# Altium footprint library LCLP.PcbLib: 75 footprints (part 5 of 5)
Each footprint in its own frame and in the unit in brackets; x right, y up, seen from the top. Pads: shape width x height; smd on the part's side, far side on the other; paste and mask are expansions set on the pad; w line width, h text height; cw(c..) or ccw(c..) is an arc to the next point about the centre after c.
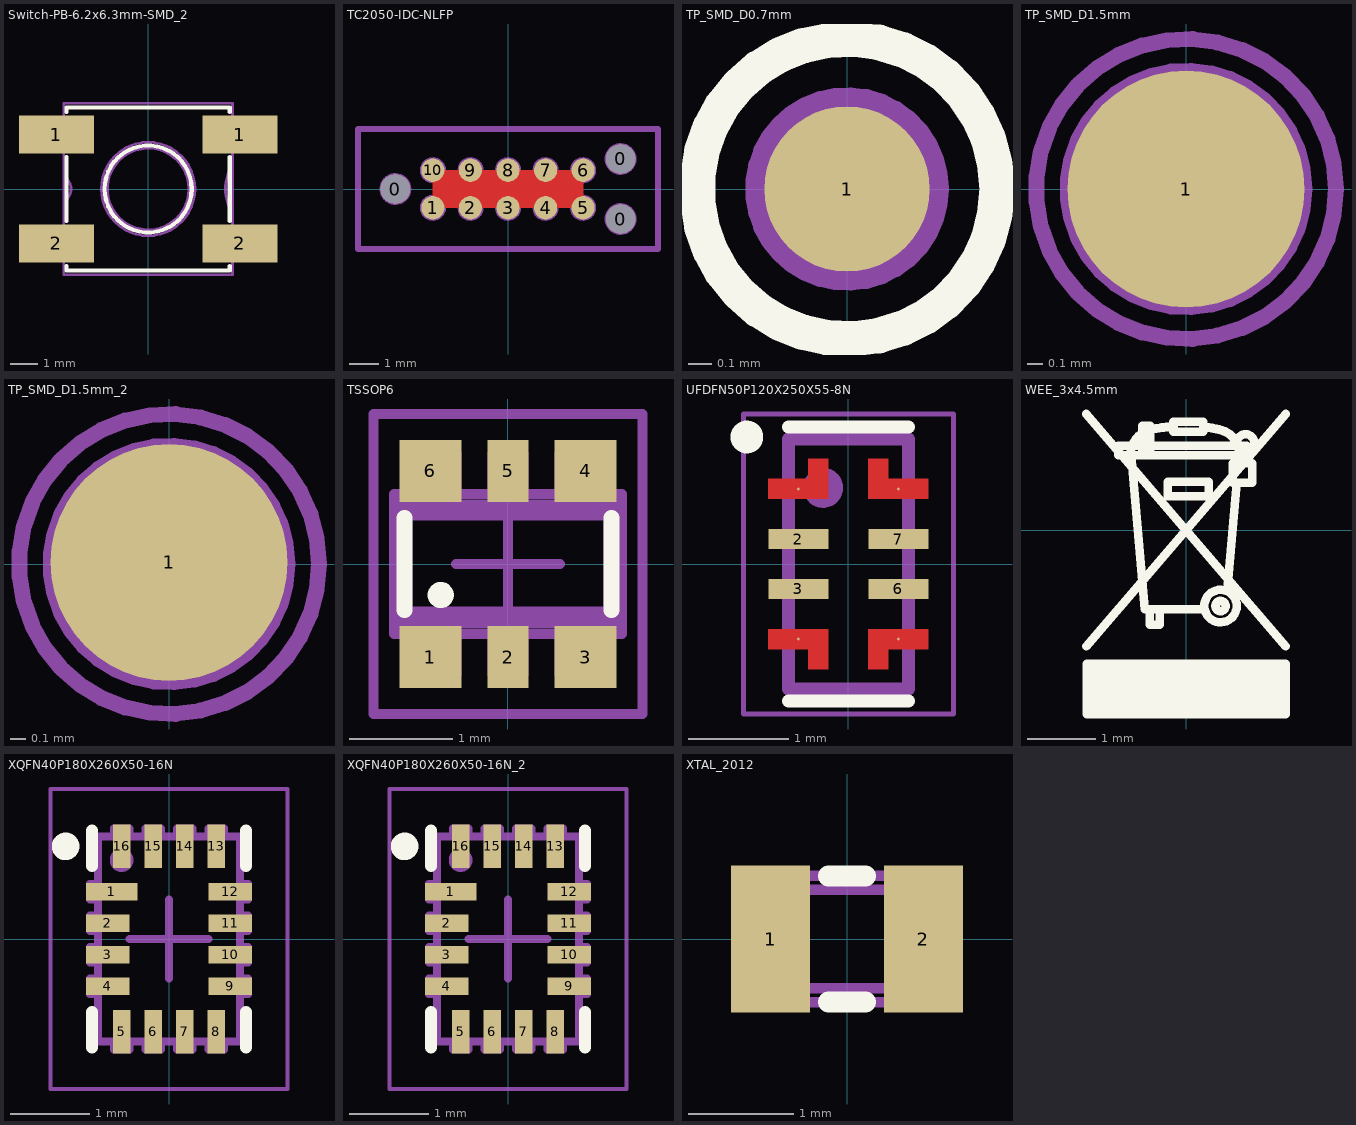
[diagram p4: the footprints below, top view; thin cyan lines are the x and y axes]

## Switch-PB-6.2x6.3mm-SMD_2 [mm]
pads (4):
  rect 2.75x1.4 smd: 1(-3.375,2) 1(3.375,2) 2(-3.375,-2) 2(3.375,-2)
Top Overlay:
  circle w0.152: c0,0 r1.601
  lines w0.152: -3,-2.826 -3,-3 3,-3 3,-2.826 ; -3,-1.174 -3,1.174 ; -3,2.826 -3,3 3,3 3,2.826 ; 3,-1.174 3,1.174
Mechanical 7:
  circle w0.1: c0,0 r1.5
  circle w0.1: c0,0 r1.721
  lines w0.1: -3.3,-2.393 -3.3,-1.606 ; -3.3,1.606 -3.3,2.393 ; -3.1,-2.393 -3.6,-2.393 -3.6,-1.606 -3.1,-1.606 ; -3.1,-0.441 ccw(c-3.335,0) -3.1,0.441 ; -3.1,1.606 -3.6,1.606 -3.6,2.393 -3.1,2.393 ; 3.1,-2.393 3.6,-2.393 3.6,-1.606 3.1,-1.606 ; 3.1,-0.91 cw(c4.561,0) 3.1,0.91 ; 3.1,1.606 3.6,1.606 3.6,2.393 3.1,2.393 ; 3.3,-2.393 3.3,-1.606 ; 3.3,1.606 3.3,2.393 ; -3.1,-3.15 3.1,-3.15 3.1,3.15 -3.1,3.15 -3.1,-3.15
  text ".Designator" at 1.525,0.102 h0.31
3D body "TS604VM1-025BR-R.step": height 2.5, standoff 0, extent -3.6,-3.1 3.6,3.1

## TC2050-IDC-NLFP [mil]
pads (13):
  round 39 hole 39 unplated mask+0.79: 0(-150,0) 0(150,-40) 0(150,40)
  round 31 smd paste-196.85: 1(-100,-25) 2(-50,-25) 3(0,-25) 4(50,-25) 5(100,-25) 6(100,25) 7(50,25) 8(0,25) 9(-50,25) 10(-100,25)
Top Layer:
  pour cut-out: -100,25 -100,-25 100,-25 100,25
Mechanical 7:
  circle w3.94: c-150,0 r19.26
  circle w3.94: c150,39.98 r19.26
  circle w3.94: c150,-39.98 r19.26
  circle w3.94: c100,24.99 r15.45
  circle w3.94: c100,-24.99 r15.45
  circle w3.94: c50,-24.99 r15.45
  circle w3.94: c50,24.99 r15.45
  circle w3.94: c-50,24.99 r15.45
  circle w3.94: c0,24.99 r15.45
  circle w3.94: c0,-24.99 r15.45
  circle w3.94: c-50,-24.99 r15.45
  circle w3.94: c-100,-24.99 r15.45
  circle w3.94: c-100,24.99 r15.45
  text ".Designator" at -59.75,-68.34 h12.01
Mechanical 8:
  circle w3.94: c150,-39.98 r19.26
  circle w3.94: c150,39.98 r19.26
  circle w3.94: c-150,0 r19.26
Mechanical 15:
  lines w7.87: -199.8,-79.92 199.8,-79.92 199.8,79.92 -199.8,79.92 -199.8,-79.92

## TP_SMD_D0.7mm [mm] "Test point - pad 0.7mm"
height 0.5
pads (1):
  round 0.7 smd paste-5: 1(0,0)
Top Overlay:
  circle w0.15: c0,0 r0.635
Mechanical 7:
  circle w0.1: c0,0 r0.635
  circle w0.1: c0,0 r0.381
  text ".Designator" at -0.274,-0.131 h0.3

## TP_SMD_D1.5mm [mm] "Test point - pad 1.5mm"
height 0.5
pads (1):
  round 1.5 smd paste-5: 1(0,0)
Mechanical 7:
  circle w0.1: c0,0 r0.75
  circle w0.1: c0,0 r0.95
  text ".Designator" at -1.524,-0.102 h0.3
3D body: height 0.05, standoff 0, extent -0.75,-0.75 0.75,0.75

## TP_SMD_D1.5mm_2 [mm]
pads (1):
  round 1.5 smd paste-5: 1(0,0.01)
Mechanical 7:
  circle w0.1: c0,0 r0.75
  circle w0.1: c0,0 r0.95
  text ".Designator" at -1.524,-0.102 h0.3
3D body: height 0.05, standoff 0, extent -0.75,-0.75 0.75,0.75

## TSSOP6 [mm] "TSSOP6 (SOT-363)"
height 1.1
pads (6):
  rect 0.6x0.6 smd: 1(-0.75,-0.9) 3(0.75,-0.9) 4(0.75,0.9) 6(-0.75,0.9)
  rect 0.4x0.6 smd: 2(0,-0.9) 5(0,0.9)
Top Overlay:
  circle w0.152: c-0.65,-0.3 r0.05
  lines w0.152: -1,-0.448 -1,0.448 ; 1,-0.448 1,0.448
Mechanical 7:
  lines w0.1: -0.975,-0.46 0.975,-0.46 ; -0.975,0.478 0.975,0.478 ; -0.8,-0.56 -0.8,-1.07 -0.5,-1.07 ; -0.8,0.56 -0.8,1.07 -0.5,1.07 -0.5,0.56 ; -0.791,-0.852 -0.527,-0.852 ; -0.791,-0.733 -0.527,-0.733 ; -0.782,-0.578 -0.518,-0.578 ; -0.782,0.578 -0.518,0.578 ; -0.773,0.733 -0.509,0.733 ; -0.773,0.852 -0.509,0.852 ; -0.5,-1.07 -0.5,-0.56 ; -0.15,-0.56 -0.15,-1.07 0.15,-1.07 0.15,-0.56 ; -0.15,0.56 -0.15,1.07 0.15,1.07 0.15,0.56 ; -0.141,-0.852 0.123,-0.852 ; -0.141,-0.733 0.123,-0.733 ; -0.132,-0.578 0.132,-0.578 ; -0.132,0.578 0.132,0.578 ; -0.123,0.733 0.141,0.733 ; -0.123,0.852 0.141,0.852 ; 0.5,0.56 0.5,1.07 ; 0.5,-0.56 0.5,-1.07 0.8,-1.07 0.8,-0.56 ; 0.5,1.07 0.8,1.07 0.8,0.56 ; 0.509,-0.852 0.773,-0.852 ; 0.509,-0.733 0.773,-0.733 ; 0.518,-0.578 0.782,-0.578 ; 0.518,0.578 0.782,0.578 ; 0.527,0.733 0.791,0.733 ; 0.527,0.852 0.791,0.852 ; -1.075,-0.551 -1.075,0.551 -1.057,0.569 1.057,0.569 1.075,0.551 1.075,-0.551 1.057,-0.569 -1.057,-0.569 -1.075,-0.551 ; -0.975,-0.469 -0.975,0.469 0.975,0.469 0.975,-0.469 -0.975,-0.469
  text ".Designator" at -0.225,-0.175 h0.31
Mechanical 13:
  lines w0.1: -1.1,-0.675 -1.1,0.675 1.1,0.675 1.1,-0.675 -1.1,-0.675
Mechanical 15:
  lines w0.1: -0.5,0 0.5,0 ; 0,-0.5 0,0.5 ; -1.3,-1.45 -1.3,1.45 1.3,1.45 1.3,-1.45 -1.3,-1.45
3D body "User Library-SC70-6.step": height 0.93, standoff -0.02, extent -1,-1.05 1,1.05

## UFDFN50P120X250X55-8N [mm]
height 0.6
pads (8):
  round 0.025 smd: 1(-0.5,0.75) 4(-0.5,-0.75) 5(0.5,-0.75) 8(0.5,0.75)
  rect 0.6x0.2 smd: 2(-0.5,0.25) 3(-0.5,-0.25) 6(0.5,-0.25) 7(0.5,0.25)
Top Layer:
  region: -0.2,0.65 -0.8,0.65 -0.8,0.85 -0.4,0.85 -0.4,1.05 -0.2,1.05
  region: 0.4,0.85 0.8,0.85 0.8,0.65 0.2,0.65 0.2,1.05 0.4,1.05
  region: -0.2,-1.05 -0.4,-1.05 -0.4,-0.85 -0.8,-0.85 -0.8,-0.65 -0.2,-0.65
  region: 0.8,-0.85 0.4,-0.85 0.4,-1.05 0.2,-1.05 0.2,-0.65 0.8,-0.65
Top Overlay:
  circle w0.2: c-1.016,1.27 r0.064
  lines w0.127: -0.6,-1.37 0.6,-1.37 ; -0.6,1.37 0.6,1.37
Mechanical 7:
  circle w0.2: c-0.254,0.762 r0.1
  lines w0.127: -0.6,-1.25 0.6,-1.25 0.6,1.25 -0.6,1.25 -0.6,-1.25
  text ".Designator" at -0.303,-0.056 h0.31
Mechanical 15:
  lines w0.05: -1.05,-1.5 -1.05,1.5 1.05,1.5 1.05,-1.5 -1.05,-1.5
3D body "step_temp.STEP": height 0.6, standoff 0, extent -0.6,-1.25 0.6,1.25

## WEE_3x4.5mm [mm]
Top Overlay:
  drawing of 38 lines, arcs and shapes, not listed

## XQFN40P180X260X50-16N [mm] "QFN, 16-Leads, Body 1.80x2.60mm, Pitch 0.40mm, IPC Medium Density"
height 0.5
pads (16):
  rect 0.65x0.22 smd paste-0.02 mask+0.035: 1(-0.725,0.6)
  rect 0.55x0.22 smd paste-0.02 mask+0.035: 2(-0.775,0.2) 3(-0.775,-0.2) 4(-0.775,-0.6) 9(0.775,-0.6) 10(0.775,-0.2) 11(0.775,0.2) 12(0.775,0.6)
  rect 0.22x0.55 smd paste-0.02 mask+0.035: 5(-0.6,-1.175) 6(-0.2,-1.175) 7(0.2,-1.175) 8(0.6,-1.175) 13(0.6,1.175) 14(0.2,1.175) 15(-0.2,1.175) 16(-0.6,1.175)
Top Overlay:
  circle w0.25: c-1.31,1.173 r0.05
  lines w0.15: -0.975,-1.375 -0.975,-0.925 ; -0.975,0.925 -0.975,1.375 ; 0.975,-1.375 0.975,-0.925 ; 0.975,0.925 0.975,1.375
Mechanical 7:
  circle w0.1: c-0.6,1 r0.1
  lines w0.1: -0.9,-0.7 -1,-0.7 -1,-0.5 -0.9,-0.5 ; -0.9,-0.3 -1,-0.3 -1,-0.1 -0.9,-0.1 ; -0.9,0.1 -1,0.1 -1,0.3 -0.9,0.3 ; -0.9,0.5 -1,0.5 -1,0.7 -0.9,0.7 ; -0.7,-1.3 -0.7,-1.4 -0.5,-1.4 -0.5,-1.3 ; -0.7,1.3 -0.7,1.4 -0.5,1.4 -0.5,1.3 ; -0.3,-1.3 -0.3,-1.4 -0.1,-1.4 -0.1,-1.3 ; -0.3,1.3 -0.3,1.4 -0.1,1.4 -0.1,1.3 ; 0.1,-1.3 0.1,-1.4 0.3,-1.4 0.3,-1.3 ; 0.1,1.3 0.1,1.4 0.3,1.4 0.3,1.3 ; 0.5,-1.3 0.5,-1.4 0.7,-1.4 0.7,-1.3 ; 0.5,1.3 0.5,1.4 0.7,1.4 0.7,1.3 ; 0.9,-0.7 1,-0.7 1,-0.5 0.9,-0.5 ; 0.9,-0.3 1,-0.3 1,-0.1 0.9,-0.1 ; 0.9,0.1 1,0.1 1,0.3 0.9,0.3 ; 0.9,0.5 1,0.5 1,0.7 0.9,0.7 ; -0.9,-1.3 -0.9,1.3 0.9,1.3 0.9,-1.3 -0.9,-1.3
  text ".Designator" at 1.524,0.102 h0.3
Mechanical 15:
  lines w0.05: -1.5,-1.9 -1.5,1.9 1.5,1.9 1.5,-1.9 -1.5,-1.9
  lines w0.1: -0.5,0 0.5,0 ; 0,-0.5 0,0.5
3D body "TMUX1109RSVR.STEP": height 0.55, standoff 0, extent -0.9,-1.3 0.9,1.3

## XQFN40P180X260X50-16N_2 [mm]
pads (16):
  rect 0.65x0.22 smd paste-0.02 mask+0.05: 1(-0.725,0.6)
  rect 0.55x0.22 smd paste-0.02 mask+0.03: 2(-0.775,0.2) 3(-0.775,-0.2) 4(-0.775,-0.6) 9(0.775,-0.6) 10(0.775,-0.2) 11(0.775,0.2) 12(0.775,0.6)
  rect 0.22x0.55 smd paste-0.02 mask+0.03: 5(-0.6,-1.175) 6(-0.2,-1.175) 7(0.2,-1.175) 8(0.6,-1.175) 13(0.6,1.175) 14(0.2,1.175) 15(-0.2,1.175) 16(-0.6,1.175)
Top Overlay:
  circle w0.25: c-1.31,1.173 r0.05
  lines w0.15: -0.975,-1.375 -0.975,-0.925 ; -0.975,0.925 -0.975,1.375 ; 0.975,-1.375 0.975,-0.925 ; 0.975,0.925 0.975,1.375
Mechanical 7:
  circle w0.1: c-0.6,1 r0.1
  lines w0.1: -0.9,-0.7 -1,-0.7 -1,-0.5 -0.9,-0.5 ; -0.9,-0.3 -1,-0.3 -1,-0.1 -0.9,-0.1 ; -0.9,0.1 -1,0.1 -1,0.3 -0.9,0.3 ; -0.9,0.5 -1,0.5 -1,0.7 -0.9,0.7 ; -0.7,-1.3 -0.7,-1.4 -0.5,-1.4 -0.5,-1.3 ; -0.7,1.3 -0.7,1.4 -0.5,1.4 -0.5,1.3 ; -0.3,-1.3 -0.3,-1.4 -0.1,-1.4 -0.1,-1.3 ; -0.3,1.3 -0.3,1.4 -0.1,1.4 -0.1,1.3 ; 0.1,-1.3 0.1,-1.4 0.3,-1.4 0.3,-1.3 ; 0.1,1.3 0.1,1.4 0.3,1.4 0.3,1.3 ; 0.5,-1.3 0.5,-1.4 0.7,-1.4 0.7,-1.3 ; 0.5,1.3 0.5,1.4 0.7,1.4 0.7,1.3 ; 0.9,-0.7 1,-0.7 1,-0.5 0.9,-0.5 ; 0.9,-0.3 1,-0.3 1,-0.1 0.9,-0.1 ; 0.9,0.1 1,0.1 1,0.3 0.9,0.3 ; 0.9,0.5 1,0.5 1,0.7 0.9,0.7 ; -0.9,-1.3 0.9,-1.3 0.9,1.3 -0.9,1.3 -0.9,-1.3
  text ".Designator" at -1.525,-0.102 h0.31
Mechanical 15:
  lines w0.05: -1.5,-1.9 1.5,-1.9 1.5,1.9 -1.5,1.9 -1.5,-1.9
  lines w0.1: -0.5,0 0.5,0 ; 0,-0.5 0,0.5
3D body "TMUX1109RSVR.STEP": height 0.55, standoff 0, extent -0.9,-1.3 0.9,1.3

## XTAL_2012 [mm] "XTAL SMD 2.0 x 1.2 mm"
height 0.8
pads (2):
  rect 0.75x1.4 smd: 1(-0.725,0) 2(0.725,0)
Top Overlay:
  lines w0.2: -0.174,-0.6 0.174,-0.6 ; -0.174,0.6 0.174,0.6
Mechanical 7:
  lines w0.1: -1,-0.5 cw(c-1,-0.6) -0.9,-0.6 0.9,-0.6 cw(c1,-0.6) 1,-0.5 1,0.5 cw(c1,0.6) 0.9,0.6 -0.9,0.6 cw(c-1,0.6) -1,0.5 -1,-0.5 ; -0.87,-0.37 ccw(c-0.77,-0.37) -0.77,-0.47 0.77,-0.47 ccw(c0.77,-0.37) 0.87,-0.37 0.87,0.37 ccw(c0.77,0.37) 0.77,0.47 -0.77,0.47 ccw(c-0.77,0.37) -0.87,0.37 -0.87,-0.37
  text ".Designator" at -1.525,-0.102 h0.31
3D body: height 0.6, standoff 0.15, extent -0.825,-0.4 0.825,0.4
3D body "User Library-ABS06.STEP": height 0.6, standoff 0, extent -1,-0.61 1,0.61